# Altium footprint library ref-packages.PCBLIB: 1543 footprints (part 53 of 103)
Each footprint in its own frame and in the unit in brackets; x right, y up, seen from the top. Pads: shape width x height; smd on the part's side, far side on the other; paste and mask are expansions set on the pad; w line width, h text height; cw(c..) or ccw(c..) is an arc to the next point about the centre after c.
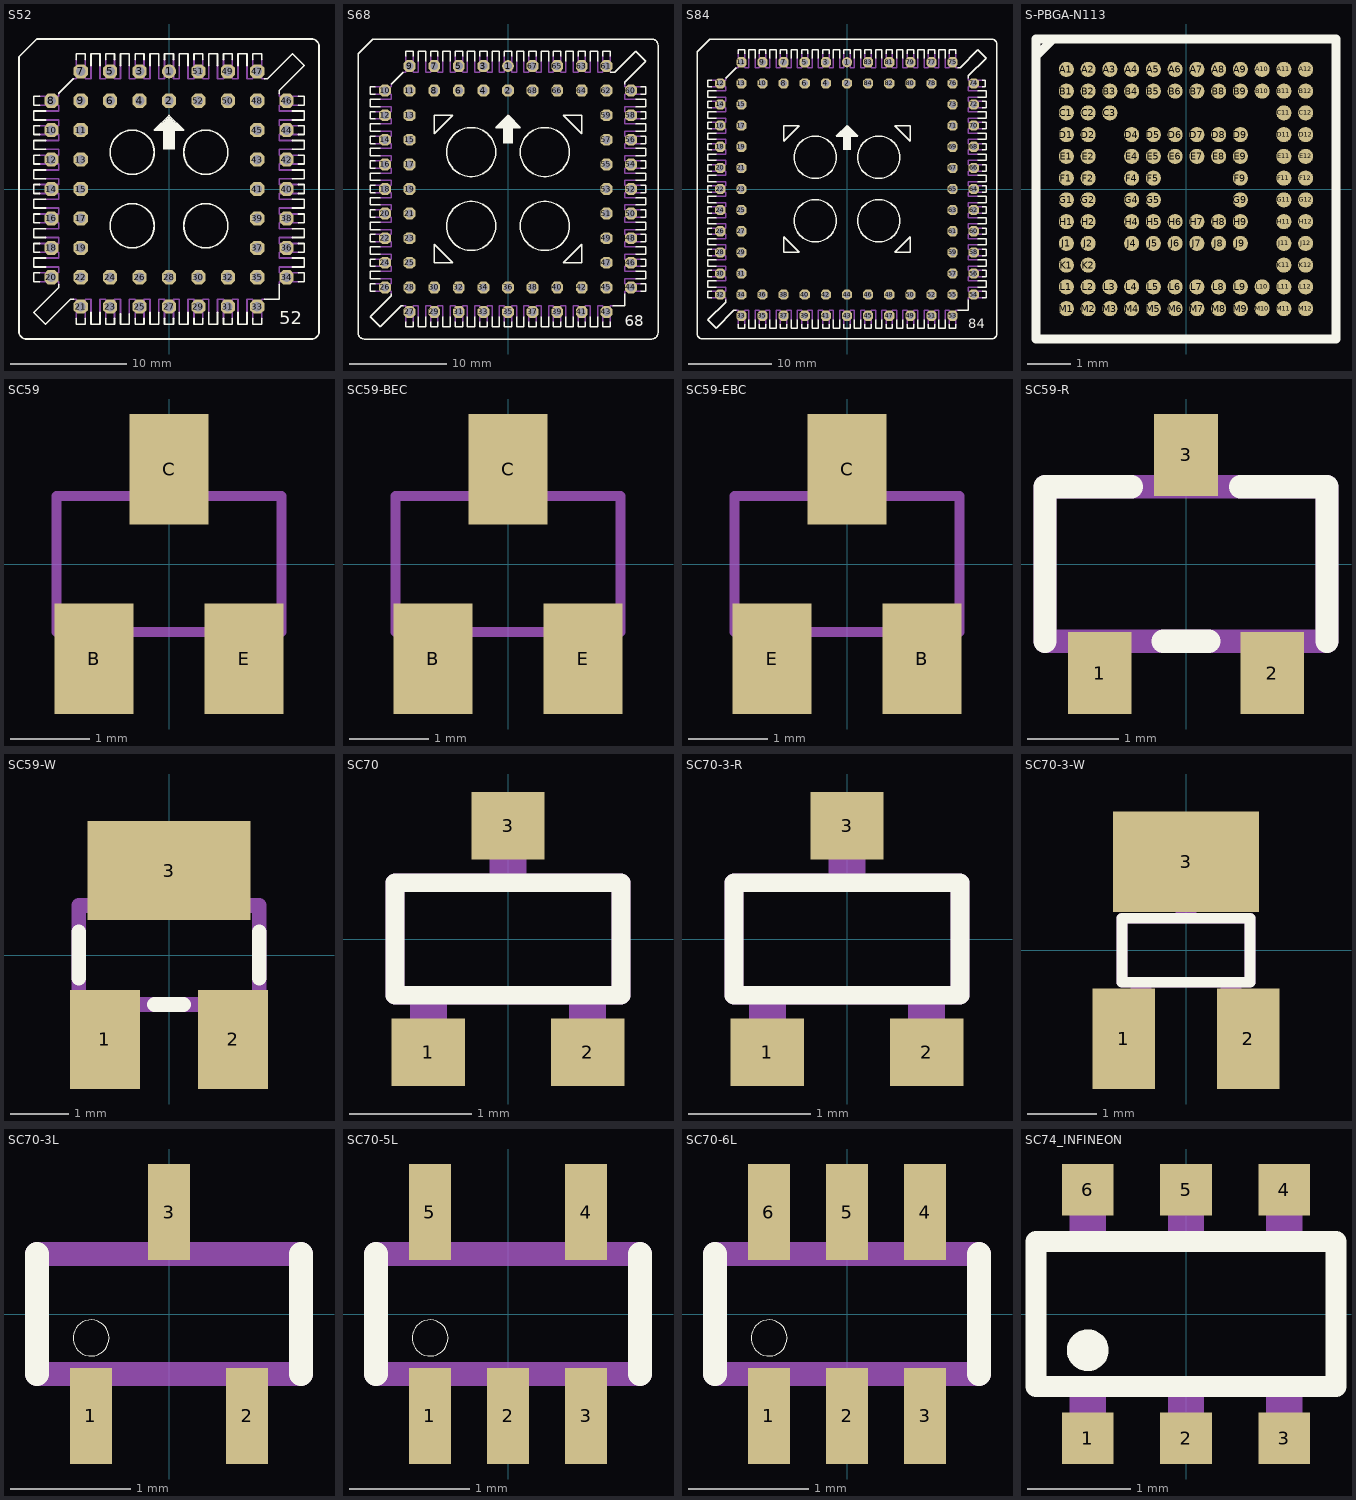
[diagram p52: the footprints below, top view; thin cyan lines are the x and y axes]

## S52 [mil]
pads (52):
  round 48 hole 32: 1(0,400)
  oct 48x48 hole 32: 2(0,300) 3(-100,400) 4(-100,300) 5(-200,400) 6(-200,300) 7(-300,400) 8(-400,300) 9(-300,300) 10(-400,200) 11(-300,200) 12(-400,100) 13(-300,100) 14(-400,0) 15(-300,0) 16(-400,-100) 17(-300,-100) 18(-400,-200) 19(-300,-200) 20(-400,-300) 21(-300,-400) 22(-300,-300) 23(-200,-400) 24(-200,-300) 25(-100,-400) 26(-100,-300) 27(0,-400) 28(0,-300) 29(100,-400) 30(100,-300) 31(200,-400) 32(200,-300) 33(300,-400) 34(400,-300) 35(300,-300) 36(400,-200) 37(300,-200) 38(400,-100) 39(300,-100) 40(400,0) 41(300,0) 42(400,100) 43(300,100) 44(400,200) 45(300,200) 46(400,300) 47(300,400) 48(300,300) 49(200,400) 50(200,300) 51(100,400) 52(100,300)
Top Overlay:
  drawing of 199 lines, arcs and shapes, not listed
  text "52" at 375,-475 h77.5
Mechanical 16:
  drawing of 160 lines, arcs and shapes, not listed

## S68 [mil]
pads (68):
  round 48 hole 32: 1(0,500)
  oct 48x48 hole 32: 2(0,400) 3(-100,500) 4(-100,400) 5(-200,500) 6(-200,400) 7(-300,500) 8(-300,400) 9(-400,500) 10(-500,400) 11(-400,400) 12(-500,300) 13(-400,300) 14(-500,200) 15(-400,200) 16(-500,100) 17(-400,100) 18(-500,0) 19(-400,0) 20(-500,-100) 21(-400,-100) 22(-500,-200) 23(-400,-200) 24(-500,-300) 25(-400,-300) 26(-500,-400) 27(-400,-500) 28(-400,-400) 29(-300,-500) 30(-300,-400) 31(-200,-500) 32(-200,-400) 33(-100,-500) 34(-100,-400) 35(0,-500) 36(0,-400) 37(100,-500) 38(100,-400) 39(200,-500) 40(200,-400) 41(300,-500) 42(300,-400) 43(400,-500) 44(500,-400) 45(400,-400) 46(500,-300) 47(400,-300) 48(500,-200) 49(400,-200) 50(500,-100) 51(400,-100) 52(500,0) 53(400,0) 54(500,100) 55(400,100) 56(500,200) 57(400,200) 58(500,300) 59(400,300) 60(500,400) 61(400,500) 62(400,400) 63(300,500) 64(300,400) 65(200,500) 66(200,400) 67(100,500) 68(100,400)
Top Overlay:
  drawing of 259 lines, arcs and shapes, not listed
  text "68" at 475,-575 h77.5
Mechanical 16:
  drawing of 207 lines, arcs and shapes, not listed

## S84 [mil]
pads (84):
  round 48 hole 32: 1(0,600)
  oct 48x48 hole 32: 2(0,500) 3(-100,600) 4(-100,500) 5(-200,600) 6(-200,500) 7(-300,600) 8(-300,500) 9(-400,600) 10(-400,500) 11(-500,600) 12(-600,500) 13(-500,500) 14(-600,400) 15(-500,400) 16(-600,300) 17(-500,300) 18(-600,200) 19(-500,200) 20(-600,100) 21(-500,100) 22(-600,0) 23(-500,0) 24(-600,-100) 25(-500,-100) 26(-600,-200) 27(-500,-200) 28(-600,-300) 29(-500,-300) 30(-600,-400) 31(-500,-400) 32(-600,-500) 33(-500,-600) 34(-500,-500) 35(-400,-600) 36(-400,-500) 37(-300,-600) 38(-300,-500) 39(-200,-600) 40(-200,-500) 41(-100,-600) 42(-100,-500) 43(0,-600) 44(0,-500) 45(100,-600) 46(100,-500) 47(200,-600) 48(200,-500) 49(300,-600) 50(300,-500) 51(400,-600) 52(400,-500) 53(500,-600) 54(600,-500) 55(500,-500) 56(600,-400) 57(500,-400) 58(600,-300) 59(500,-300) 60(600,-200) 61(500,-200) 62(600,-100) 63(500,-100) 64(600,0) 65(500,0) 66(600,100) 67(500,100) 68(600,200) 69(500,200) 70(600,300) 71(500,300) 72(600,400) 73(500,400) 74(600,500) 75(500,600) 76(500,500) 77(400,600) 78(400,500) 79(300,600) 80(300,500) 81(200,600) 82(200,500) 83(100,600) 84(100,500)
Top Overlay:
  drawing of 307 lines, arcs and shapes, not listed
  text "84" at 575,-675 h77.5
Mechanical 16:
  drawing of 256 lines, arcs and shapes, not listed

## S-PBGA-N113 [mm]
pads (111):
  rrect100% 0.35x0.35 smd: A1(-2.75,2.75) A2(-2.25,2.75) A3(-1.75,2.75) A4(-1.25,2.75) A5(-0.75,2.75) A6(-0.25,2.75) A7(0.25,2.75) A8(0.75,2.75) A9(1.25,2.75) A10(1.75,2.75) A11(2.25,2.75) A12(2.75,2.75) B1(-2.75,2.25) B2(-2.25,2.25) B3(-1.75,2.25) B4(-1.25,2.25) B5(-0.75,2.25) B6(-0.25,2.25) B7(0.25,2.25) B8(0.75,2.25) B9(1.25,2.25) B10(1.75,2.25) B11(2.25,2.25) B12(2.75,2.25) C1(-2.75,1.75) C2(-2.25,1.75) C3(-1.75,1.75) C11(2.25,1.75) C12(2.75,1.75) D1(-2.75,1.25) D2(-2.25,1.25) D4(-1.25,1.25) D5(-0.75,1.25) D6(-0.25,1.25) D7(0.25,1.25) D8(0.75,1.25) D9(1.25,1.25) D11(2.25,1.25) D12(2.75,1.25) E1(-2.75,0.75) E2(-2.25,0.75) E4(-1.25,0.75) E5(-0.75,0.75) E6(-0.25,0.75) E7(0.25,0.75) E8(0.75,0.75) E9(1.25,0.75) E11(2.25,0.75) E12(2.75,0.75) F1(-2.75,0.25) F2(-2.25,0.25) F4(-1.25,0.25) F5(-0.75,0.25) F9(1.25,0.25) F11(2.25,0.25) F12(2.75,0.25) G1(-2.75,-0.25) G2(-2.25,-0.25) G4(-1.25,-0.25) G5(-0.75,-0.25) G9(1.25,-0.25) G11(2.25,-0.25) G12(2.75,-0.25) H1(-2.75,-0.75) H2(-2.25,-0.75) H4(-1.25,-0.75) H5(-0.75,-0.75) H6(-0.25,-0.75) H7(0.25,-0.75) H8(0.75,-0.75) H9(1.25,-0.75) H11(2.25,-0.75) H12(2.75,-0.75) J1(-2.75,-1.25) J2(-2.25,-1.25) J4(-1.25,-1.25) J5(-0.75,-1.25) J6(-0.25,-1.25) J7(0.25,-1.25) J8(0.75,-1.25) J9(1.25,-1.25) J11(2.25,-1.25) J12(2.75,-1.25) K1(-2.75,-1.75) K2(-2.25,-1.75) K11(2.25,-1.75) K12(2.75,-1.75) L1(-2.75,-2.25) L2(-2.25,-2.25) L3(-1.75,-2.25) L4(-1.25,-2.25) L5(-0.75,-2.25) L6(-0.25,-2.25) L7(0.25,-2.25) L8(0.75,-2.25) L9(1.25,-2.25) L10(1.75,-2.25) L11(2.25,-2.25) L12(2.75,-2.25) M1(-2.75,-2.75) M2(-2.25,-2.75) M3(-1.75,-2.75) M4(-1.25,-2.75) M5(-0.75,-2.75) M6(-0.25,-2.75) M7(0.25,-2.75) M8(0.75,-2.75) M9(1.25,-2.75) M10(1.75,-2.75) M11(2.25,-2.75) M12(2.75,-2.75)
Top Overlay:
  lines w0.203: -3.448,3.05 -3.448,3.448 -3.05,3.448 ; -3.448,3.05 -3.448,-3.448 3.448,-3.448 3.448,3.448 -3.05,3.448 ; -3.448,3.05 -3.05,3.448
Top Solder:
  circle w0: c2.25,-2.75 r0.175
  circle w0: c1.75,-2.75 r0.175
  circle w0: c1.25,-2.75 r0.175
  circle w0: c0.75,-2.75 r0.175
  circle w0: c0.25,-2.75 r0.175
  circle w0: c-0.25,-2.75 r0.175
  circle w0: c-0.75,-2.75 r0.175
  circle w0: c-1.25,-2.75 r0.175
  circle w0: c-1.75,-2.75 r0.175
  circle w0: c-2.25,-2.75 r0.175
  circle w0: c2.75,-2.25 r0.175
  circle w0: c1.75,-2.25 r0.175
  circle w0: c1.25,-2.25 r0.175
  circle w0: c0.75,-2.25 r0.175
  circle w0: c0.25,-2.25 r0.175
  circle w0: c-0.25,-2.25 r0.175
  circle w0: c-0.75,-2.25 r0.175
  circle w0: c-1.25,-2.25 r0.175
  circle w0: c-1.75,-2.25 r0.175
  circle w0: c-2.75,-2.25 r0.175
  circle w0: c2.75,-1.75 r0.175
  circle w0: c2.25,-1.75 r0.175
  circle w0: c-2.25,-1.75 r0.175
  circle w0: c-2.75,-1.75 r0.175
  circle w0: c2.75,-1.25 r0.175
  circle w0: c2.25,-1.25 r0.175
  circle w0: c0.75,-1.25 r0.175
  circle w0: c0.25,-1.25 r0.175
  circle w0: c-0.25,-1.25 r0.175
  circle w0: c-0.75,-1.25 r0.175
  circle w0: c-2.25,-1.25 r0.175
  circle w0: c-2.75,-1.25 r0.175
  circle w0: c2.75,-0.75 r0.175
  circle w0: c2.25,-0.75 r0.175
  circle w0: c1.25,-0.75 r0.175
  circle w0: c0.25,-0.75 r0.175
  circle w0: c-0.25,-0.75 r0.175
  circle w0: c-0.75,-0.75 r0.175
  circle w0: c-1.25,-0.75 r0.175
  circle w0: c-2.25,-0.75 r0.175
  circle w0: c-2.75,-0.75 r0.175
  circle w0: c2.75,-0.25 r0.175
  circle w0: c2.25,-0.25 r0.175
  circle w0: c1.25,-0.25 r0.175
  circle w0: c-0.75,-0.25 r0.175
  circle w0: c-1.25,-0.25 r0.175
  circle w0: c-2.25,-0.25 r0.175
  circle w0: c-2.75,-0.25 r0.175
  circle w0: c2.75,0.25 r0.175
  circle w0: c2.25,0.25 r0.175
  circle w0: c1.25,0.25 r0.175
  circle w0: c-0.75,0.25 r0.175
  circle w0: c-1.25,0.25 r0.175
  circle w0: c-2.25,0.25 r0.175
  circle w0: c-2.75,0.25 r0.175
  circle w0: c2.75,0.75 r0.175
  circle w0: c2.25,0.75 r0.175
  circle w0: c1.25,0.75 r0.175
  circle w0: c0.75,0.75 r0.175
  circle w0: c0.25,0.75 r0.175
  circle w0: c-0.25,0.75 r0.175
  circle w0: c-0.75,0.75 r0.175
  circle w0: c-1.25,0.75 r0.175
  circle w0: c-2.25,0.75 r0.175
  circle w0: c-2.75,0.75 r0.175
  circle w0: c2.75,1.25 r0.175
  circle w0: c2.25,1.25 r0.175
  circle w0: c0.75,1.25 r0.175
  circle w0: c0.25,1.25 r0.175
  circle w0: c-0.25,1.25 r0.175
  circle w0: c-0.75,1.25 r0.175
  circle w0: c-2.25,1.25 r0.175
  circle w0: c-2.75,1.25 r0.175
  circle w0: c2.75,1.75 r0.175
  circle w0: c2.25,1.75 r0.175
  circle w0: c-1.75,1.75 r0.175
  circle w0: c-2.25,1.75 r0.175
  circle w0: c-2.75,1.75 r0.175
  circle w0: c2.75,2.25 r0.175
  circle w0: c1.75,2.25 r0.175
  circle w0: c1.25,2.25 r0.175
  circle w0: c0.75,2.25 r0.175
  circle w0: c0.25,2.25 r0.175
  circle w0: c-0.25,2.25 r0.175
  circle w0: c-0.75,2.25 r0.175
  circle w0: c-1.25,2.25 r0.175
  circle w0: c-1.75,2.25 r0.175
  circle w0: c-2.25,2.25 r0.175
  circle w0: c-2.75,2.25 r0.175
  circle w0: c2.25,2.75 r0.175
  circle w0: c1.75,2.75 r0.175
  circle w0: c1.25,2.75 r0.175
  circle w0: c0.75,2.75 r0.175
  circle w0: c0.25,2.75 r0.175
  circle w0: c-0.25,2.75 r0.175
  circle w0: c-0.75,2.75 r0.175
  circle w0: c-1.25,2.75 r0.175
  circle w0: c-1.75,2.75 r0.175
  circle w0: c-2.25,2.75 r0.175
  circle w0: c-2.75,2.75 r0.175
  circle w0: c-2.75,-2.75 r0.175
  circle w0: c-2.25,-2.25 r0.175
  circle w0: c2.75,-2.75 r0.175
  circle w0: c2.25,-2.25 r0.175
  circle w0: c2.25,2.25 r0.175
  circle w0: c2.75,2.75 r0.175
  circle w0: c-1.25,1.25 r0.175
  circle w0: c1.25,1.25 r0.175
  circle w0: c-1.25,-1.25 r0.175
  circle w0: c1.25,-1.25 r0.175
  circle w0: c0.75,-0.75 r0.175

## SC59 [mm]
pads (3):
  rect 1x1.4 smd: B(-0.95,-1.2) C(0,1.2) E(0.95,-1.2)
Mechanical 16:
  rectangle: -0.229,0.911 0.229,1.495
  rectangle: 0.711,-1.495 1.168,-0.911
  rectangle: -1.168,-1.495 -0.711,-0.911
  lines w0.127: -1.422,-0.86 1.422,-0.86 1.422,0.86 -1.422,0.86 -1.422,-0.86

## SC59-BEC [mm]
pads (3):
  rect 1x1.4 smd: B(-0.95,-1.2) C(0,1.2) E(0.95,-1.2)
Mechanical 16:
  rectangle: -0.229,0.911 0.229,1.495
  rectangle: 0.711,-1.495 1.168,-0.911
  rectangle: -1.168,-1.495 -0.711,-0.911
  lines w0.127: -1.422,-0.86 1.422,-0.86 1.422,0.86 -1.422,0.86 -1.422,-0.86

## SC59-EBC [mm]
pads (3):
  rect 1x1.4 smd: B(0.95,-1.2) C(0,1.2) E(-0.95,-1.2)
Mechanical 16:
  rectangle: -0.229,0.911 0.229,1.495
  rectangle: 0.711,-1.495 1.168,-0.911
  rectangle: -1.168,-1.495 -0.711,-0.911
  lines w0.127: -1.422,-0.86 1.422,-0.86 1.422,0.86 -1.422,0.86 -1.422,-0.86

## SC59-R [mil]
pads (3):
  rect 27.56x35.43 smd: 1(-37.4,-47.24) 2(37.4,-47.24) 3(0,47.24)
Top Overlay:
  lines w10: -61.02,-33.46 -61.02,33.46 -23.62,33.46 ; -9.84,-33.46 9.84,-33.46 ; 23.62,33.46 61.02,33.46 61.02,-33.46
Mechanical 16:
  rectangle: -45.28,-59.06 -29.53,-37.4
  rectangle: 29.53,-59.06 45.28,-37.4
  rectangle: -7.87,37.4 7.87,59.06
  lines w10: -61.02,-33.46 61.02,-33.46 61.02,33.46 -61.02,33.46 -61.02,-33.46

## SC59-W [mil]
pads (3):
  rect 47.24x66.93 smd: 1(-43.31,-57.09) 2(43.31,-57.09)
  rect 110.24x66.93 smd: 3(0,57.09)
Top Overlay:
  lines w10: -61.02,-15.75 -61.02,15.75 ; -9.84,-33.46 9.84,-33.46 ; 61.02,-15.75 61.02,15.75
Mechanical 16:
  rectangle: -45.28,-59.06 -29.53,-37.4
  rectangle: 29.53,-59.06 45.28,-37.4
  rectangle: -7.87,37.4 7.87,59.06
  lines w10: -61.02,-33.46 61.02,-33.46 61.02,33.46 -61.02,33.46 -61.02,-33.46

## SC70 [mm]
pads (3):
  rect 0.6x0.55 smd: 1(-0.65,-0.925) 2(0.65,-0.925) 3(0,0.925)
Top Overlay:
  lines w0.152: -0.923,-0.461 0.923,-0.461 0.923,0.461 -0.923,0.461 -0.923,-0.461
Mechanical 16:
  rectangle: -0.8,-1.1 -0.5,-0.5
  rectangle: 0.5,-1.1 0.8,-0.5
  rectangle: -0.15,0.5 0.15,1.1
  lines w0.152: -0.923,-0.461 0.923,-0.461 0.923,0.461 -0.923,0.461 -0.923,-0.461

## SC70-3-R [mm]
pads (3):
  rect 0.6x0.55 smd: 1(-0.65,-0.925) 2(0.65,-0.925) 3(0,0.925)
Top Overlay:
  lines w0.152: -0.923,-0.461 0.923,-0.461 0.923,0.461 -0.923,0.461 -0.923,-0.461
Mechanical 16:
  rectangle: -0.8,-1.1 -0.5,-0.5
  rectangle: 0.5,-1.1 0.8,-0.5
  rectangle: -0.15,0.5 0.15,1.1
  lines w0.152: -0.923,-0.461 0.923,-0.461 0.923,0.461 -0.923,0.461 -0.923,-0.461

## SC70-3-W [mil]
pads (3):
  rect 35.43x57.09 smd: 1(-35.43,-50.2) 2(35.43,-50.2)
  rect 82.68x57.09 smd: 3(0,50.2)
Top Overlay:
  lines w6: -36.32,-18.13 36.32,-18.13 36.32,18.13 -36.32,18.13 -36.32,-18.13
Mechanical 16:
  rectangle: -31.5,-43.31 -19.69,-19.69
  rectangle: 19.69,-43.31 31.5,-19.69
  rectangle: -5.91,19.69 5.91,43.31
  lines w6: -36.32,-18.13 36.32,-18.13 36.32,18.13 -36.32,18.13 -36.32,-18.13

## SC70-3L [mm]
pads (3):
  rect 0.35x0.8 smd: 1(-0.65,-0.85) 2(0.65,-0.85) 3(0,0.85)
Top Overlay:
  circle w0: c-0.65,-0.2 r0.15
  lines w0.203: -1.1,-0.5 -1.1,0.5 ; 1.1,-0.5 1.1,0.5
Mechanical 16:
  rectangle: -0.8,-1.1 -0.5,-0.6
  rectangle: 0.5,-1.1 0.8,-0.6
  rectangle: -0.15,0.6 0.15,1.1
  lines w0.203: -1.1,-0.5 1.1,-0.5 ; -1.1,0.5 1.1,0.5

## SC70-5L [mm]
pads (5):
  rect 0.35x0.8 smd: 1(-0.65,-0.85) 2(0,-0.85) 3(0.65,-0.85) 4(0.65,0.85) 5(-0.65,0.85)
Top Overlay:
  circle w0: c-0.65,-0.2 r0.15
  lines w0.203: -1.1,-0.5 -1.1,0.5 ; 1.1,-0.5 1.1,0.5
Mechanical 16:
  rectangle: 0.5,0.6 0.8,1.1
  rectangle: -0.8,0.6 -0.5,1.1
  rectangle: -0.8,-1.1 -0.5,-0.6
  rectangle: -0.15,-1.1 0.15,-0.6
  rectangle: 0.5,-1.1 0.8,-0.6
  lines w0.203: -1.1,-0.5 1.1,-0.5 ; -1.1,0.5 1.1,0.5

## SC70-6L [mm]
pads (6):
  rect 0.35x0.8 smd: 1(-0.65,-0.85) 2(0,-0.85) 3(0.65,-0.85) 4(0.65,0.85) 5(0,0.85) 6(-0.65,0.85)
Top Overlay:
  circle w0: c-0.65,-0.2 r0.15
  lines w0.203: -1.1,-0.5 -1.1,0.5 ; 1.1,-0.5 1.1,0.5
Mechanical 16:
  rectangle: -0.8,-1.1 -0.5,-0.6
  rectangle: -0.15,-1.1 0.15,-0.6
  rectangle: 0.5,-1.1 0.8,-0.6
  rectangle: 0.5,0.6 0.8,1.1
  rectangle: -0.15,0.6 0.15,1.1
  rectangle: -0.8,0.6 -0.5,1.1
  lines w0.203: -1.1,-0.5 1.1,-0.5 ; -1.1,0.5 1.1,0.5

## SC74_INFINEON [mil]
pads (6):
  rect 19.69x19.69 smd: 1(-37.4,-47.24) 2(0,-47.24) 3(37.4,-47.24) 4(37.4,47.24) 5(0,47.24) 6(-37.4,47.24)
Top Overlay:
  circle w8: c-37.4,-13.78 r3.94
  lines w8: -57.09,-27.56 -57.09,27.56 57.09,27.56 57.09,-27.56 -57.09,-27.56
Mechanical 16:
  rectangle: -44.29,-51.18 -30.51,-30.51
  rectangle: -6.89,-51.18 6.89,-30.51
  rectangle: 30.51,-51.18 44.29,-30.51
  rectangle: 30.51,30.51 44.29,51.18
  rectangle: -6.89,30.51 6.89,51.18
  rectangle: -44.29,30.51 -30.51,51.18